# Altium footprint library MyPcb.PcbLib: 367 footprints (part 12 of 23)
Each footprint in its own frame and in the unit in brackets; x right, y up, seen from the top. Pads: shape width x height; smd on the part's side, far side on the other; paste and mask are expansions set on the pad; w line width, h text height; cw(c..) or ccw(c..) is an arc to the next point about the centre after c.
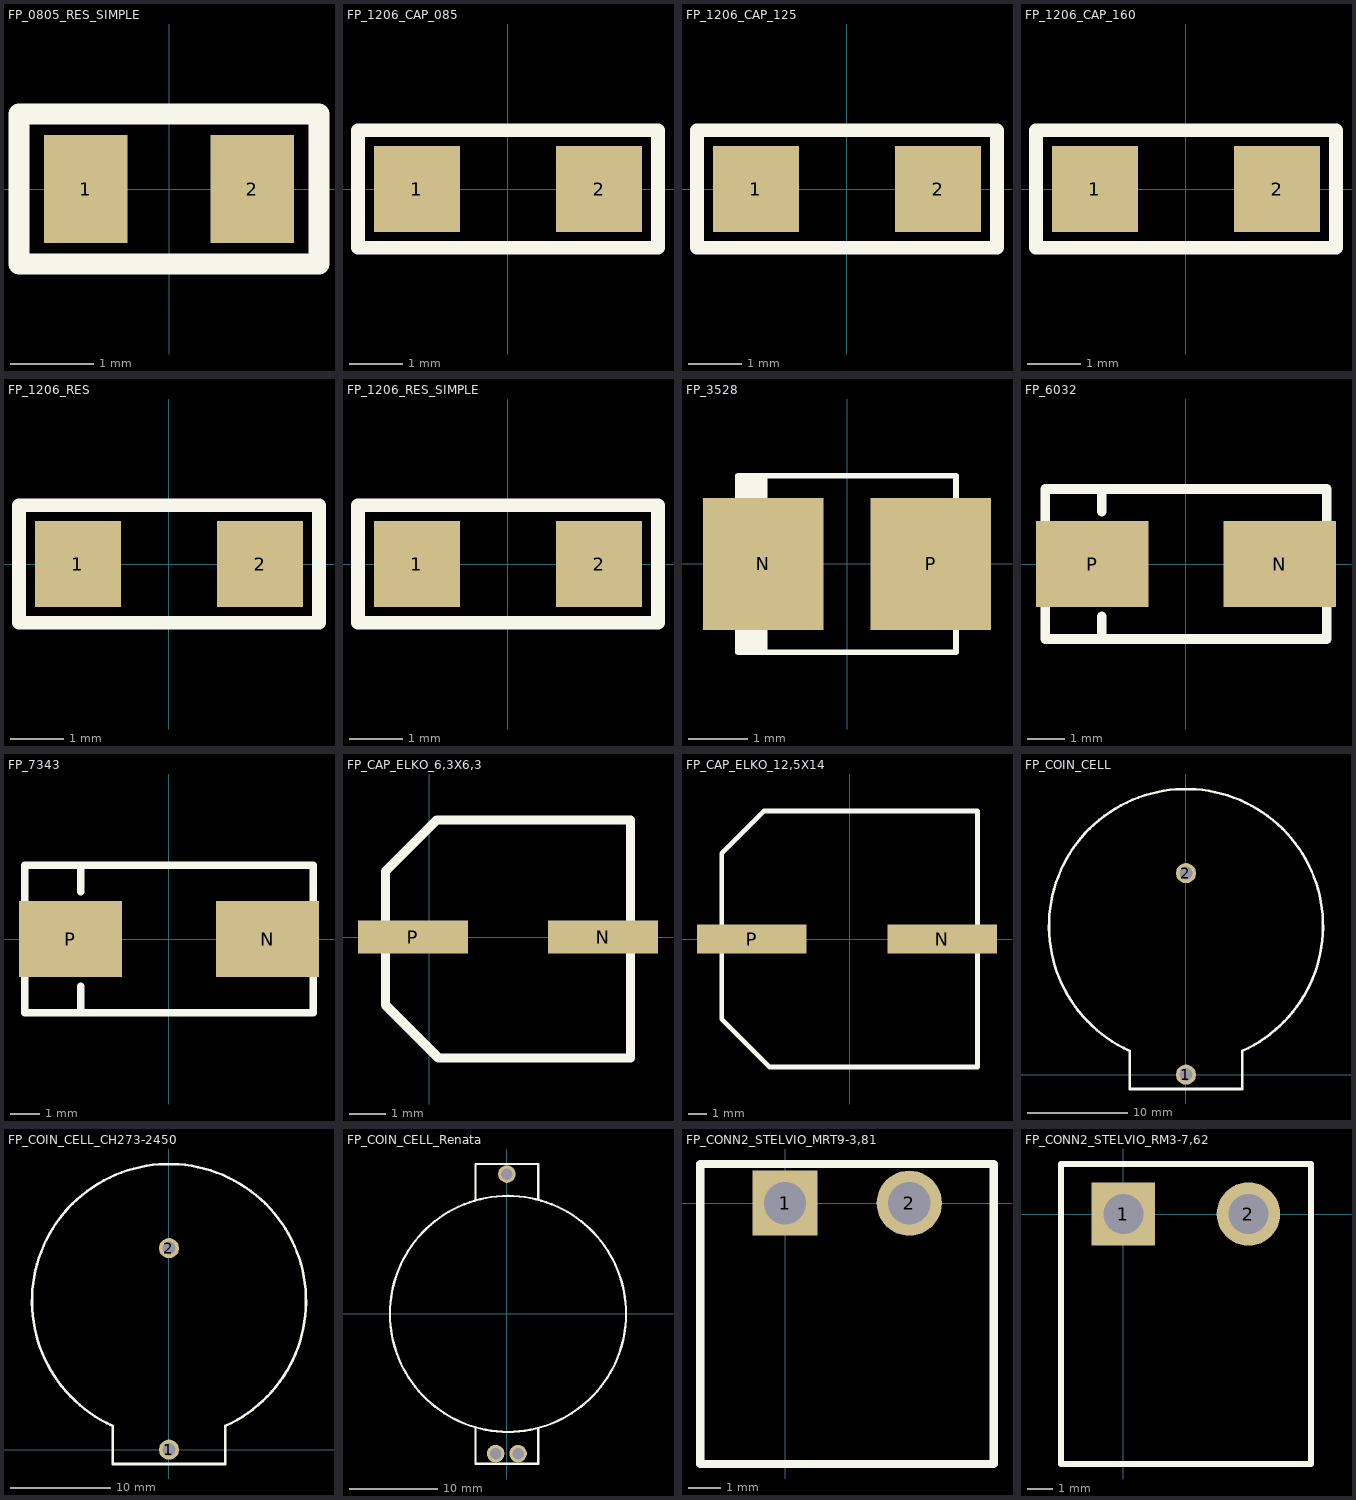
[diagram p11: the footprints below, top view; thin cyan lines are the x and y axes]

## FP_0805_RES_SIMPLE [mm] "0805 ellenállás, amit én csináltam"
height 0.5
pads (2):
  rect 1x1.3 smd: 1(-1,0) 2(1,0)
Top Overlay:
  lines w0.254: -1.8,-0.9 1.8,-0.9 1.8,0.9 -1.8,0.9 -1.8,-0.9
3D body: height 0.5, standoff 0, extent -1,-0.635 -0.644,0.635
3D body: height 0.5, standoff 0, extent 0.676,-0.635 1.032,0.635
3D body: height 0.5, standoff 0, extent -0.644,-0.635 0.676,0.635

## FP_1206_CAP_085 [mm] "1206 kapacitás 0.85 mm"
height 0.86
pads (2):
  rect 1.6x1.6 smd: 1(-1.7,0) 2(1.7,0)
Top Overlay:
  lines w0.254: -2.8,-1.1 -2.8,1.1 2.8,1.1 2.8,-1.1 -2.8,-1.1
3D body: height 0.85, standoff 0, extent -1.522,-0.787 -1.065,0.787
3D body: height 0.85, standoff 0, extent 1.119,-0.787 1.577,0.787
3D body: height 0.85, standoff 0, extent -1.065,-0.787 1.119,0.787

## FP_1206_CAP_125 [mm] "1206 kapacitás 1.25 mm"
height 1.27
pads (2):
  rect 1.6x1.6 smd: 1(-1.7,0) 2(1.7,0)
Top Overlay:
  lines w0.254: -2.8,-1.1 -2.8,1.1 2.8,1.1 2.8,-1.1 -2.8,-1.1
3D body: height 1.25, standoff 0, extent -1.522,-0.787 -1.065,0.787
3D body: height 1.25, standoff 0, extent 1.119,-0.787 1.577,0.787
3D body: height 1.25, standoff 0, extent -1.065,-0.787 1.119,0.787

## FP_1206_CAP_160 [mm] "1206 kapacitás 1.6mm magas"
height 1.62
pads (2):
  rect 1.6x1.6 smd: 1(-1.7,0) 2(1.7,0)
Top Overlay:
  lines w0.254: -2.8,-1.1 2.8,-1.1 2.8,1.1 -2.8,1.1 -2.8,-1.1
3D body: height 1.6, standoff 0, extent -1.065,-0.787 1.119,0.787
3D body: height 1.6, standoff 0, extent 1.119,-0.787 1.577,0.787
3D body: height 1.6, standoff 0, extent -1.522,-0.787 -1.065,0.787

## FP_1206_RES [mm] "1206 ellenállás"
height 0.5
pads (2):
  rect 1.6x1.6 smd: 1(-1.7,0) 2(1.7,0)
Top Overlay:
  lines w0.254: -2.8,-1.1 -2.8,1.1 2.8,1.1 2.8,-1.1 -2.8,-1.1
3D body "1206RES.STEP": height 0.62, standoff 0.02, extent -1.6,-0.8 1.6,0.8

## FP_1206_RES_SIMPLE [mm] "1206 ellenállás, amit én csináltam"
height 0.5
pads (2):
  rect 1.6x1.6 smd: 1(-1.7,0) 2(1.7,0)
Top Overlay:
  lines w0.254: -2.8,-1.1 2.8,-1.1 2.8,1.1 -2.8,1.1 -2.8,-1.1
3D body: height 0.5, standoff 0, extent -1.065,-0.787 1.119,0.787
3D body: height 0.5, standoff 0, extent 1.119,-0.787 1.577,0.787
3D body: height 0.5, standoff 0, extent -1.522,-0.787 -1.065,0.787

## FP_3528 [mm] "3528 TANTÁL SMD \"B\"-TOK"
height 1.9
pads (2):
  rect 2.05x2.25 smd: N(-1.425,0) P(1.425,0)
Top Overlay:
  rectangle: -1.85,-1.5 -1.352,1.5
  lines w0.1: -1.85,-1.5 -1.85,1.5 1.85,1.5 1.85,-1.5 -1.85,-1.5
3D body "CAP3528-B.STEP": height 2.11, standoff -0.04, extent -2.517,-1.499 2.482,1.499

## FP_6032 [mm]
pads (2):
  rect 3x2.3 smd: N(2.5,0) P(-2.5,0)
Top Overlay:
  lines w0.254: -2.25,-2 -2.25,-1.4 ; -2.25,1.4 -2.25,2 ; -3.75,-2 3.75,-2 3.75,2 -3.75,2 -3.75,-2
3D body "CAP6032-C.STEP": height 2.79, standoff -0.04, extent -3.763,-1.735 3.835,1.778

## FP_7343 [mm]
pads (2):
  rect 3.5x2.6 smd: N(3.35,0) P(-3.35,0)
Top Overlay:
  lines w0.254: -3,-2.5 -3,-1.6 ; -3,1.6 -3,2.5 ; -4.9,-2.5 -4.9,2.5 4.9,2.5 4.9,-2.5 -4.9,-2.5
3D body "CAP7343-D.STEP": height 3.1, standoff -0.04, extent -4.494,-2.305 4.502,2.305

## FP_CAP_ELKO_6,3X6,3 [mm] "680 uF/SMD-NIC 47 uF/SMD-NIC ELKO 16 V 105°C 20 % KIS IMPEDANCIÁS SMD O6,3x6,3mm"
height 6.3
pads (2):
  rect 3x0.9 smd: N(4.75,0) P(-0.45,0)
Top Overlay:
  lines w0.254: -1.2,-1.852 -1.2,1.8 0.2,3.2 5.5,3.2 5.5,-3.3 0.248,-3.3 -1.2,-1.852
3D body: height 0.3, standoff 0, extent -1.25,-3.3 5.35,3.3
3D body: height 6.3, standoff 0, extent -1.1,-3.137 5.175,3.15

## FP_CAP_ELKO_12,5X14 [mm] "680 uF/SMD-NIC ELKO 35 V 105°C 20 % KIS IMPEDANCIÁS SMD O12.5x14mm"
height 14
pads (2):
  rect 6x1.6 smd: N(5.066,0) P(-5.348,0)
Top Overlay:
  lines w0.254: -7,-4.4 -4.4,-7 7,-7 7,7 -4.7,7 -7,4.7 -7,-4.4
3D body: height 0.3, standoff 0, extent -7,-7 7,7
3D body: height 14, standoff 0, extent -6.226,-6.05 6.225,6.425

## FP_COIN_CELL [mm] "CR2450 Battery holder"
pads (2):
  round 2 hole 1.3: 1(0,0) 2(0,20)
Top Overlay:
  lines w0.254: -5.618,2.365 cw(c0,14.75) 5.607,2.36 ; -5.6,2.35 -5.6,-1.425 5.6,-1.425 5.6,2.35
3D body "User Library-CR2450_Holder.STEP": height 11.5, standoff -2.28, extent -13.375,-1.22 13.375,28.125

## FP_COIN_CELL_CH273-2450 [mm] "CR2450 Battery holder"
pads (2):
  round 2 hole 1.3: 1(0,0) 2(0,20)
Top Overlay:
  lines w0.254: -5.618,2.365 cw(c0,14.75) 5.607,2.36 ; -5.6,2.35 -5.6,-1.425 5.6,-1.425 5.6,2.35
3D body "User Library-CR2450_Holder.STEP": height 11.5, standoff -2.28, extent -13.375,-1.22 13.375,28.125

## FP_COIN_CELL_Renata [mm] "CR2450 Battery holder"
pads (3):
  round 2 hole 1.3: 1_PLUS(-1.27,-15.875) 1_PLUS(1.27,-15.875) 2_MIN(0,15.875)
Top Overlay:
  circle w0.254: c0.127,0 r13.4
  lines w0.254: -3.556,-12.954 -3.556,-17.018 3.528,-17.018 3.556,-17.046 3.556,-12.954 ; -3.556,12.954 -3.556,17.018 3.556,17.018 3.556,12.954

## FP_CONN2_STELVIO_MRT9-3,81 [mm] "STELVIO gyártmányú sorkapocs csatlakozó MRT9 fekvõ"
height 7.25
pads (2):
  rect 2x2 hole 1.3: 1(0,0)
  round 2 hole 1.3: 2(3.81,0)
Top Overlay:
  lines w0.254: -2.6,-8 -2.6,1.2 6.4,1.2 6.4,-8 -2.6,-8
3D body: height 0, standoff -3, extent 3.41,-0.4 4.21,0.4
3D body: height 0, standoff -3, extent -0.4,-0.4 0.4,0.4
3D body: height 7.25, standoff 6.75, extent -1.5,-8 5.4,-1.2
3D body: height 1, standoff 0, extent -1.5,-8 5.4,-1.2
3D body: height 7.25, standoff 0, extent 1.65,-8 2.15,-1.2
3D body: height 7.25, standoff 0, extent 5.4,-8 6.4,-1.2
3D body: height 7.25, standoff 0, extent -2.5,-1.2 6.4,1.2
3D body: height 7.25, standoff 0, extent -2.5,-8 -1.5,-1.2

## FP_CONN2_STELVIO_RM3-7,62 [mm] "STELVIO CPM 7,62/2-SQ"
height 8.3
pads (2):
  rect 2.54x2.54 hole 1.6: 1(0,0)
  round 2.54 hole 1.6: 2(5,0)
Top Overlay:
  lines w0.254: -2.5,-10 -2.5,2 7.5,2 7.5,-10 -2.5,-10
3D body: height 4.3, standoff 3.3, extent 4.5,-9.5 5.5,-0.5
3D body: height 4.3, standoff 3.3, extent -0.5,-9.5 0.5,-0.5
3D body: height 0, standoff -3.5, extent 4.5,-0.5 5.5,0.5
3D body: height 0, standoff -3.5, extent -0.5,-0.5 0.5,0.5
3D body: height 8.3, standoff 7.3, extent -2.1,-10 7.1,-1.2
3D body: height 1, standoff 0, extent -2.1,-10 7.1,-1.2
3D body: height 8.3, standoff 0, extent 7.1,-10 7.5,-1.2
3D body: height 8.3, standoff 0, extent -2.5,-1.2 7.5,2
3D body: height 8.3, standoff 0, extent -2.5,-10 -2.1,-1.2